# Altium footprint library PcbLib.PcbLib: 428 footprints (part 13 of 27)
Each footprint in its own frame and in the unit in brackets; x right, y up, seen from the top. Pads: shape width x height; smd on the part's side, far side on the other; paste and mask are expansions set on the pad; w line width, h text height; cw(c..) or ccw(c..) is an arc to the next point about the centre after c.
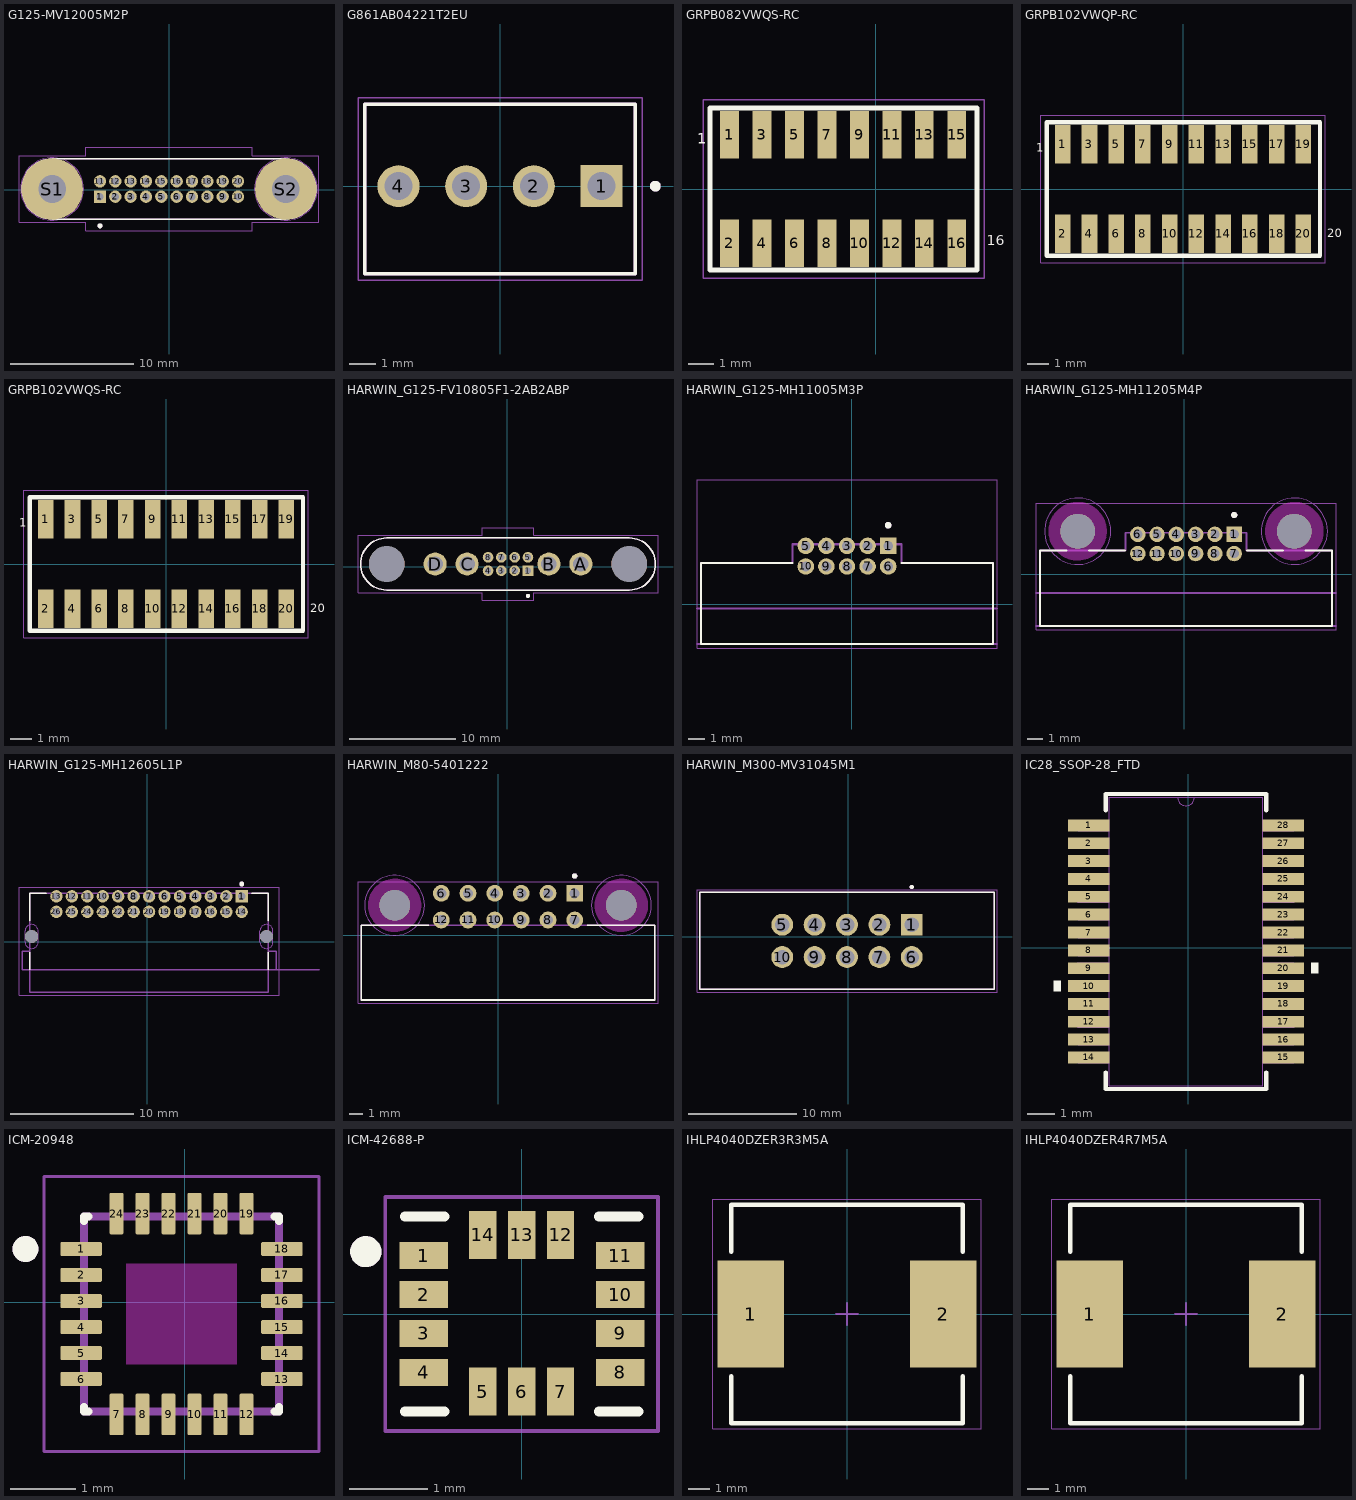
[diagram p12: the footprints below, top view; thin cyan lines are the x and y axes]

## G125-MV12005M2P [mm] "HARWIN Male Vertical Connector, 1.25mm Pitch, 10+10 contacts"
pads (22):
  rect 1x1 / inner round 1 / far side rect 1x1 hole 0.6: 1(-5.665,-0.581)
  round 1 hole 0.6: 2(-4.415,-0.581) 3(-3.165,-0.581) 4(-1.915,-0.581) 5(-0.665,-0.581) 6(0.585,-0.581) 7(1.835,-0.581) 8(3.085,-0.581) 9(4.335,-0.581) 10(5.585,-0.581) 11(-5.665,0.669) 12(-4.415,0.669) 13(-3.165,0.669) 14(-1.915,0.669) 15(-0.665,0.669) 16(0.585,0.669) 17(1.835,0.669) 18(3.085,0.669) 19(4.335,0.669) 20(5.585,0.669)
  round 5 hole 2.25 unplated: S1(-9.565,0.044) S2(9.485,0.044)
Top Overlay:
  circle w0.2: c-5.665,-2.956 r0.1
  lines w0.127: -12.015,0.044 ccw(c-9.565,0.044) -9.565,-2.406 9.485,-2.406 ccw(c9.485,0.044) 11.935,0.044 ccw(c9.485,0.044) 9.485,2.494 -9.565,2.494 ccw(c-9.565,0.044) -12.015,0.044
Mechanical 13:
  circle w0.2: c-5.665,-2.956 r0.1
  lines w0.127: -12.015,0.044 ccw(c-9.565,0.044) -9.565,-2.406 9.485,-2.406 ccw(c9.485,0.044) 11.935,0.044 ccw(c9.485,0.044) 9.485,2.494 -9.565,2.494 ccw(c-9.565,0.044) -12.015,0.044
Mechanical 15:
  lines w0.05: -12.265,-2.656 -12.265,2.744 -6.815,2.744 -6.815,3.444 6.735,3.444 6.735,2.744 12.185,2.744 12.185,-2.656 6.735,-2.656 6.735,-3.356 -6.815,-3.356 -6.815,-2.656 -12.265,-2.656
Mechanical 16:
  circle w0.05: c-9.565,0.044 r2.56
  circle w0.05: c9.485,0.044 r2.56
3D body "g125-mv12005m2p.stp": height 5, standoff -4.9, extent -11.996,-2.386 11.954,2.514

## G861AB04221T2EU [mm]
pads (4):
  rect 1.575x1.575 / inner round 1.575 / far side rect 1.575x1.575 hole 1.05: 1(3.81,0)
  round 1.575 hole 1.05: 2(1.27,0) 3(-1.27,0) 4(-3.81,0)
Top Overlay:
  circle w0.2: c5.83,0 r0.1
  lines w0.127: -5.08,-3.28 -5.08,3.07 5.08,3.07 5.08,-3.28 -5.08,-3.28
Mechanical 13:
  circle w0.2: c5.83,0 r0.1
  lines w0.127: -5.08,-3.28 -5.08,3.07 5.08,3.07 5.08,-3.28 -5.08,-3.28
Mechanical 15:
  lines w0.05: -5.33,-3.53 -5.33,3.32 5.33,3.32 5.33,-3.53 -5.33,-3.53
3D body "step_temp.STEP": height 10.8, standoff -3.4, extent -5.08,-3.28 5.08,3.07

## GRPB082VWQS-RC [mm]
pads (16):
  rect 0.74x1.85 smd: 1(-5.715,2.125) 2(-5.715,-2.125) 3(-4.445,2.125) 4(-4.445,-2.125) 5(-3.175,2.125) 6(-3.175,-2.125) 7(-1.905,2.125) 8(-1.905,-2.125) 9(-0.635,2.125) 10(-0.635,-2.125) 11(0.635,2.125) 12(0.635,-2.125) 13(1.905,2.125) 14(1.905,-2.125) 15(3.175,2.125) 16(3.175,-2.125)
Top Overlay:
  lines w0.2: -6.477,-3.175 3.961,-3.175 3.961,3.175 -6.477,3.175 -6.477,-3.175
  text "1" at -6.985,1.778 h0.41
  text "16" at 4.343,-2.192 h0.41
Mechanical 15:
  lines w0.05: -6.75,-3.5 4.252,-3.5 4.252,3.5 -6.75,3.5 -6.75,-3.5
3D body "GRPB082VWQS-RC.STEP": height 5, standoff 0, extent -6.343,-2.695 3.817,2.411

## GRPB102VWQP-RC [mm]
pads (20):
  rect 0.74x1.85 smd: 1(-5.715,2.125) 2(-5.715,-2.125) 3(-4.445,2.125) 4(-4.445,-2.125) 5(-3.175,2.125) 6(-3.175,-2.125) 7(-1.905,2.125) 8(-1.905,-2.125) 9(-0.635,2.125) 10(-0.635,-2.125) 11(0.635,2.125) 12(0.635,-2.125) 13(1.905,2.125) 14(1.905,-2.125) 15(3.175,2.125) 16(3.175,-2.125) 17(4.445,2.125) 18(4.445,-2.125) 19(5.715,2.125) 20(5.715,-2.125)
Top Overlay:
  lines w0.2: -6.477,-3.175 -6.477,3.175 6.502,3.175 6.502,-3.175 -6.477,-3.175
  text "20" at 6.858,-2.286 h0.41
  text "1" at -6.985,1.778 h0.41
Mechanical 15:
  lines w0.05: -6.75,-3.5 -6.75,3.5 6.75,3.5 6.75,-3.5 -6.75,-3.5
3D body "_ _ _B102VWQP-RC.STEP": height 5, standoff -0.5, extent -6.35,-2.54 6.35,2.56

## GRPB102VWQS-RC [mm]
pads (20):
  rect 0.74x1.85 smd: 1(-5.715,2.125) 2(-5.715,-2.125) 3(-4.445,2.125) 4(-4.445,-2.125) 5(-3.175,2.125) 6(-3.175,-2.125) 7(-1.905,2.125) 8(-1.905,-2.125) 9(-0.635,2.125) 10(-0.635,-2.125) 11(0.635,2.125) 12(0.635,-2.125) 13(1.905,2.125) 14(1.905,-2.125) 15(3.175,2.125) 16(3.175,-2.125) 17(4.445,2.125) 18(4.445,-2.125) 19(5.715,2.125) 20(5.715,-2.125)
Top Overlay:
  lines w0.2: -6.477,-3.175 6.502,-3.175 6.502,3.175 -6.477,3.175 -6.477,-3.175
  text "1" at -6.985,1.778 h0.41
  text "20" at 6.858,-2.286 h0.41
Mechanical 15:
  lines w0.05: -6.75,-3.5 6.75,-3.5 6.75,3.5 -6.75,3.5 -6.75,-3.5
3D body "_ _ _B102VWQP-RC.STEP": height 5, standoff -0.5, extent -6.35,-2.54 6.35,2.56

## HARWIN_G125-FV10805F1-2AB2ABP [mm] "HARWIN Power to the Board FML VRTCL 4PW 8 SIG Connector"
pads (14):
  rect 1x1 / inner round 1 / far side rect 1x1 hole 0.6: 1(1.952,-0.373)
  round 1 hole 0.6: 2(0.702,-0.373) 3(-0.548,-0.373) 4(-1.798,-0.373) 5(1.952,0.877) 6(0.702,0.877) 7(-0.548,0.877) 8(-1.798,0.877)
  round 2.175 hole 1.45: A(6.927,0.252) B(3.927,0.252) C(-3.773,0.252) D(-6.773,0.252)
  round 3.35 hole 3.35 unplated: ""(-11.323,0.252) ""(11.477,0.252)
Top Overlay:
  circle w0.2: c1.952,-2.748 r0.1
  lines w0.127: -13.773,0.252 cw(c-11.323,0.252) -11.323,2.702 11.477,2.702 cw(c11.477,0.252) 13.927,0.252 cw(c11.477,0.252) 11.477,-2.198 -11.323,-2.198 cw(c-11.323,0.252) -13.773,0.252
Mechanical 13:
  circle w0.2: c1.952,-2.748 r0.1
  lines w0.127: -13.773,0.252 cw(c-11.323,0.252) -11.323,2.702 11.477,2.702 cw(c11.477,0.252) 13.927,0.252 cw(c11.477,0.252) 11.477,-2.198 -11.323,-2.198 cw(c-11.323,0.252) -13.773,0.252
Mechanical 15:
  lines w0.05: -14.023,-2.448 -2.323,-2.448 -2.323,-3.148 2.477,-3.148 2.477,-2.448 14.177,-2.448 14.177,2.952 2.477,2.952 2.477,3.652 -2.323,3.652 -2.323,2.952 -14.023,2.952 -14.023,-2.448
3D body "G125-FV10805F1-2AB2AB_asm.stp": height 5, standoff -5.15, extent -13.771,-2.207 13.929,2.693

## HARWIN_G125-MH11005M3P [mm] "HARWIN 5+5 MALE Conn. Screw Lock Mount"
pads (10):
  rect 1x1 / inner round 1 / far side rect 1x1 hole 0.6: 1(2.224,3.542)
  round 1 hole 0.6: 2(0.974,3.542) 3(-0.276,3.542) 4(-1.526,3.542) 5(-2.776,3.542) 6(2.224,2.292) 7(0.974,2.292) 8(-0.276,2.292) 9(-1.526,2.292) 10(-2.776,2.292)
Top Overlay:
  circle w0.2: c2.224,4.792 r0.1
  lines w0.127: -3.596,2.492 -9.126,2.492 -9.126,-2.408 8.574,-2.408 8.574,2.492 3.044,2.492
Mechanical 13:
  circle w0.2: c2.224,4.792 r0.1
  lines w0.127: -9.376,-2.408 8.824,-2.408 ; -9.376,-0.258 8.824,-0.258 ; -9.126,-2.408 8.574,-2.408 8.574,2.492 3.024,2.492 3.024,3.642 -3.576,3.642 -3.576,2.492 -9.126,2.492 -9.126,-2.408
  text "PCB edge for Shielded Cable" at -7.276,-1.208 h0.81
  text "PCB edge for Unshielded Cable" at -7.276,-3.708 h0.81
Mechanical 15:
  lines w0.05: -9.376,-2.658 -9.376,7.542 8.824,7.542 8.824,-2.658 -9.376,-2.658
3D body "G125-MH11005M4P--3DModel-STEP-56544.STEP": height 5.25, standoff -3.3, extent -9.154,-2.415 8.546,5.285

## HARWIN_G125-MH11205M4P [mm] "HARWIN 6+6 Pos Male Connector Screw-Lock Board Mount"
pads (14):
  rect 1x1 / inner round 1 / far side rect 1x1 hole 0.6: 1(3.253,2.602)
  round 1 hole 0.6: 2(2.003,2.602) 3(0.753,2.602) 4(-0.497,2.602) 5(-1.747,2.602) 6(-2.997,2.602) 7(3.253,1.352) 8(2.003,1.352) 9(0.753,1.352) 10(-0.497,1.352) 11(-1.747,1.352) 12(-2.997,1.352)
  round 2.25 hole 2.25 unplated: ""(-6.897,2.802) ""(7.153,2.802)
Top Overlay:
  circle w0.2: c3.253,3.852 r0.1
  lines w0.127: -7.627,1.552 -9.347,1.552 -9.347,-3.348 9.603,-3.348 9.603,1.552 7.883,1.552 ; -6.167,1.552 -3.817,1.552 ; 4.073,1.552 6.423,1.552
Keep-Out Layer:
  circle w1.9: c7.153,2.802 r0.95
  circle w1.9: c7.153,2.802 r0.95
  circle w1.9: c-6.897,2.802 r0.95
  circle w1.9: c-6.897,2.802 r0.95
Mechanical 13:
  circle w0.2: c3.253,3.852 r0.1
  lines w0.127: -9.597,-3.348 9.853,-3.348 ; -9.597,-1.198 9.853,-1.198 ; -9.347,-3.348 9.603,-3.348 9.603,1.552 4.053,1.552 4.053,2.702 -3.797,2.702 -3.797,1.552 -9.347,1.552 -9.347,-3.348
  text "PCB edge for Shielded Cable" at -6.872,-2.398 h0.81
  text "PCB edge for Unshielded Cable" at -6.872,-4.648 h0.81
Mechanical 15:
  lines w0.05: -9.597,-3.598 -9.597,4.602 9.853,4.602 9.853,-3.598 -9.597,-3.598
Mechanical 16:
  circle w0.05: c7.153,2.802 r2.15
  circle w0.05: c-6.897,2.802 r2.15
3D body "step_temp.STEP": height 5.25, standoff -3.3, extent -9.347,-3.348 9.603,4.352

## HARWIN_G125-MH12605L1P [mm] "Gecko DIL Male Horizontal 3.3mm Throughboard Connector, Latches for 1.6mm thick PCB, gold, pick & place (cut tape packing), 13+13 contacts"
pads (28):
  rect 1x1 / inner round 1 / far side rect 1x1 hole 0.6: 1(7.664,3.683)
  round 1 hole 0.6: 2(6.414,3.683) 3(5.164,3.683) 4(3.914,3.683) 5(2.664,3.683) 6(1.414,3.683) 7(0.164,3.683) 8(-1.086,3.683) 9(-2.336,3.683) 10(-3.586,3.683) 11(-4.836,3.683) 12(-6.086,3.683) 13(-7.336,3.683) 14(7.664,2.433) 15(6.414,2.433) 16(5.164,2.433) 17(3.914,2.433) 18(2.664,2.433) 19(1.414,2.433) 20(0.164,2.433) 21(-1.086,2.433) 22(-2.336,2.433) 23(-3.586,2.433) 24(-4.836,2.433) 25(-6.086,2.433) 26(-7.336,2.433)
  round 1.05 hole 1.05 unplated: ""(-9.336,0.433) ""(9.664,0.433)
Top Overlay:
  circle w0.2: c7.664,4.683 r0.1
  lines w0.127: -9.486,-2.267 -9.486,-0.862 ; -9.486,1.728 -9.486,3.933 -8.156,3.933 ; 8.484,3.933 9.814,3.933 9.814,1.728 ; 9.814,-2.267 9.814,-0.862
Top Solder:
  drawing of 2 lines, arcs and shapes, not listed
Bottom Solder:
  drawing of 2 lines, arcs and shapes, not listed
Mechanical 1:
  lines w0: -9.861,-0.017 ccw(c-9.336,-0.017) -9.336,-0.542 ccw(c-9.336,-0.017) -8.811,-0.017 -8.811,0.883 ccw(c-9.336,0.883) -9.336,1.408 ccw(c-9.336,0.883) -9.861,0.883 -9.861,-0.017 ; 9.139,-0.017 ccw(c9.664,-0.017) 9.664,-0.542 ccw(c9.664,-0.017) 10.189,-0.017 10.189,0.883 ccw(c9.664,0.883) 9.664,1.408 ccw(c9.664,0.883) 9.139,0.883 9.139,-0.017
Mechanical 13:
  circle w0.2: c7.664,4.683 r0.1
  lines w0.127: 13.914,-2.267 10.439,-2.267 ; -9.486,-2.267 -9.486,-0.747 ; -9.486,-2.267 9.814,-2.267 ; -9.486,-2.267 -9.486,-4.067 9.814,-4.067 9.814,-2.267 ; -9.486,-2.267 -10.111,-2.267 -10.111,-0.747 -9.486,-0.747 ; -9.486,-0.747 -9.486,3.933 9.814,3.933 9.814,-0.747 ; 9.814,-2.267 9.814,-0.747 ; 9.814,-2.267 10.439,-2.267 ; 9.814,-0.747 10.439,-0.747 10.439,-2.267
  text "PCB EDGE" at 10.914,-2.067 h1.02
Mechanical 15:
  lines w0.05: -10.361,-4.317 -10.361,4.433 10.689,4.433 10.689,-4.317 -10.361,-4.317
3D body "step_temp.STEP": height 5.5, standoff -3.24, extent -10.026,-4.067 10.354,4.133

## HARWIN_M80-5401222 [mm] "HARWIN 6+6 Datamate J-Tek MALE 3mm connector"
pads (14):
  rect 1.258x1.258 / inner round 1.258 / far side rect 1.258x1.258 hole 0.75: 1(5.723,3.16)
  round 1.258 hole 0.75: 2(3.723,3.16) 3(1.723,3.16) 4(-0.277,3.16) 5(-2.277,3.16) 6(-4.277,3.16) 7(5.723,1.16) 8(3.723,1.16) 9(1.723,1.16) 10(-0.277,1.16) 11(-2.277,1.16) 12(-4.277,1.16)
  round 2.3 hole 2.3 unplated: ""(-7.777,2.26) ""(9.223,2.26)
Top Overlay:
  circle w0.2: c5.723,4.46 r0.1
  lines w0.127: -5.226,0.76 -10.277,0.76 -10.277,-4.84 11.723,-4.84 11.723,0.76 6.672,0.76
Keep-Out Layer:
  circle w2: c9.223,2.26 r1
  circle w2: c-7.777,2.26 r1
  circle w2: c9.223,2.26 r1
  circle w2: c-7.777,2.26 r1
Mechanical 13:
  circle w0.2: c5.723,4.46 r0.1
  lines w0.127: -10.277,-4.84 11.723,-4.84 11.723,0.76 -10.277,0.76 -10.277,-4.84
Mechanical 15:
  lines w0.05: -10.527,-5.09 11.973,-5.09 11.973,4.039 -10.527,4.039 -10.527,-5.09
Mechanical 16:
  circle w0.05: c9.223,2.26 r2.25
  circle w0.05: c-7.777,2.26 r2.25

## HARWIN_M300-MV31045M1 [mm] "HARWIN 10 Pin MALE VRTCL Connector"
pads (10):
  rect 2.025x2.025 / inner round 2.025 / far side rect 2.025x2.025 hole 1.35: 1(5.89,1.102)
  round 2.025 hole 1.35: 2(2.89,1.102) 3(-0.11,1.102) 4(-3.11,1.102) 5(-6.11,1.102) 6(5.89,-1.898) 7(2.89,-1.898) 8(-0.11,-1.898) 9(-3.11,-1.898) 10(-6.11,-1.898)
Top Overlay:
  circle w0.2: c5.89,4.602 r0.1
  lines w0.127: -13.76,-4.898 13.54,-4.898 13.54,4.102 -13.76,4.102 -13.76,-4.898
Mechanical 13:
  circle w0.2: c5.89,4.602 r0.1
  lines w0.127: -13.76,-4.898 13.54,-4.898 13.54,4.102 -13.76,4.102 -13.76,-4.898
Mechanical 15:
  lines w0.05: -14.01,-5.148 -14.01,4.352 13.79,4.352 13.79,-5.148 -14.01,-5.148
3D body "m300-mv31045m1.stp": height 6.9, standoff -3.2, extent -13.76,-4.898 13.54,4.102

## IC28_SSOP-28_FTD [mm]
pads (28):
  rect 1.506x0.431 smd paste+0 mask+0: 1(-3.623,4.454) 2(-3.623,3.804) 3(-3.623,3.154) 4(-3.623,2.504) 5(-3.623,1.854) 6(-3.623,1.204) 7(-3.623,0.554) 8(-3.623,-0.096) 9(-3.623,-0.746) 10(-3.623,-1.396) 11(-3.623,-2.046) 12(-3.623,-2.696) 13(-3.623,-3.346) 14(-3.623,-3.996) 15(3.471,-3.996) 16(3.471,-3.346) 17(3.471,-2.696) 18(3.471,-2.046) 19(3.471,-1.396) 20(3.471,-0.746) 21(3.471,-0.096) 22(3.471,0.554) 23(3.471,1.204) 24(3.471,1.854) 25(3.471,2.504) 26(3.471,3.154) 27(3.471,3.804) 28(3.471,4.454)
Top Overlay:
  region: -4.63,-1.206 -4.884,-1.206 -4.884,-1.587 -4.63,-1.587
  region: 4.477,-0.556 4.731,-0.556 4.731,-0.937 4.477,-0.937
  lines w0.152: -2.997,-4.545 -2.997,-5.143 2.845,-5.143 2.845,-4.545 ; -2.997,5.002 -2.997,5.601 2.845,5.601 2.845,5.002
Mechanical 13:
  lines w0.025: -0.381,5.474 ccw(c-0.076,5.474) 0.229,5.474 ; -4.026,-4.187 -4.026,-3.806 -2.87,-3.806 -2.87,-4.187 -4.026,-4.187 ; -4.026,-3.537 -4.026,-3.156 -2.87,-3.156 -2.87,-3.537 -4.026,-3.537 ; -4.026,-2.887 -4.026,-2.506 -2.87,-2.506 -2.87,-2.887 -4.026,-2.887 ; -4.026,-2.237 -4.026,-1.856 -2.87,-1.856 -2.87,-2.237 -4.026,-2.237 ; -4.026,-1.587 -4.026,-1.206 -2.87,-1.206 -2.87,-1.587 -4.026,-1.587 ; -4.026,-0.937 -4.026,-0.556 -2.87,-0.556 -2.87,-0.937 -4.026,-0.937 ; -4.026,-0.287 -4.026,0.094 -2.87,0.094 -2.87,-0.287 -4.026,-0.287 ; -4.026,0.363 -4.026,0.744 -2.87,0.744 -2.87,0.363 -4.026,0.363 ; -4.026,1.013 -4.026,1.394 -2.87,1.394 -2.87,1.013 -4.026,1.013 ; -4.026,1.663 -4.026,2.044 -2.87,2.044 -2.87,1.663 -4.026,1.663 ; -4.026,2.313 -4.026,2.694 -2.87,2.694 -2.87,2.313 -4.026,2.313 ; -4.026,2.963 -4.026,3.344 -2.87,3.344 -2.87,2.963 -4.026,2.963 ; -4.026,3.613 -4.026,3.994 -2.87,3.994 -2.87,3.613 -4.026,3.613 ; -4.026,4.263 -4.026,4.644 -2.87,4.644 -2.87,4.263 -4.026,4.263 ; -2.87,-5.016 2.718,-5.016 2.718,5.474 -2.87,5.474 -2.87,-5.016 ; 2.718,-4.187 2.718,-3.806 3.873,-3.806 3.873,-4.187 2.718,-4.187 ; 2.718,-3.537 2.718,-3.156 3.873,-3.156 3.873,-3.537 2.718,-3.537 ; 2.718,-2.887 2.718,-2.506 3.873,-2.506 3.873,-2.887 2.718,-2.887 ; 2.718,-2.237 2.718,-1.856 3.873,-1.856 3.873,-2.237 2.718,-2.237 ; 2.718,-1.587 2.718,-1.206 3.873,-1.206 3.873,-1.587 2.718,-1.587 ; 2.718,-0.937 2.718,-0.556 3.873,-0.556 3.873,-0.937 2.718,-0.937 ; 2.718,-0.287 2.718,0.094 3.873,0.094 3.873,-0.287 2.718,-0.287 ; 2.718,0.363 2.718,0.744 3.873,0.744 3.873,0.363 2.718,0.363 ; 2.718,1.013 2.718,1.394 3.873,1.394 3.873,1.013 2.718,1.013 ; 2.718,1.663 2.718,2.044 3.873,2.044 3.873,1.663 2.718,1.663 ; 2.718,2.313 2.718,2.694 3.873,2.694 3.873,2.313 2.718,2.313 ; 2.718,2.963 2.718,3.344 3.873,3.344 3.873,2.963 2.718,2.963 ; 2.718,3.613 2.718,3.994 3.873,3.994 3.873,3.613 2.718,3.613 ; 2.718,4.263 2.718,4.644 3.873,4.644 3.873,4.263 2.718,4.263
3D body "IC28_SSOP-28_FTD.step": height 2.01, standoff 0, extent -4.026,-5.016 3.874,5.474

## ICM-20948 [mm] "gyroscope"
pads (24):
  rrect25% 0.64x0.22 smd: 1(-1.596,0.822) 2(-1.596,0.422) 3(-1.596,0.022) 4(-1.596,-0.378) 5(-1.596,-0.778) 6(-1.596,-1.178) 13(1.494,-1.178) 14(1.494,-0.778) 15(1.494,-0.378) 16(1.494,0.022) 17(1.494,0.422) 18(1.494,0.822)
  rrect25% 0.22x0.64 smd: 7(-1.051,-1.723) 8(-0.651,-1.723) 9(-0.251,-1.723) 10(0.149,-1.723) 11(0.549,-1.723) 12(0.949,-1.723) 19(0.949,1.367) 20(0.549,1.367) 21(0.149,1.367) 22(-0.251,1.367) 23(-0.651,1.367) 24(-1.051,1.367)
Top Overlay:
  circle w0.2: c-2.451,0.822 r0.1
  lines w0.127: -1.551,-1.608 -1.551,-1.678 -1.481,-1.678 ; -1.551,1.252 -1.551,1.322 -1.481,1.322 ; 1.379,-1.678 1.449,-1.678 1.449,-1.608 ; 1.379,1.322 1.449,1.322 1.449,1.252
Keep-Out Layer:
  region: 0.799,-0.948 -0.901,-0.948 -0.901,0.592 0.799,0.592
Mechanical 13:
  circle w0.2: c-2.451,0.822 r0.1
  lines w0.127: -1.551,-1.678 -1.551,1.322 1.449,1.322 1.449,-1.678 -1.551,-1.678
Mechanical 15:
  lines w0.05: -2.166,-2.293 -2.166,1.937 2.064,1.937 2.064,-2.293 -2.166,-2.293
3D body "step_temp.STEP": height 1, standoff -0.05, extent -1.551,-1.678 1.449,1.322

## ICM-42688-P [mm]
pads (14):
  rect 0.62x0.35 smd: 1(-1.255,0.75) 2(-1.255,0.25) 3(-1.255,-0.25) 4(-1.255,-0.75) 8(1.265,-0.75) 9(1.265,-0.25) 10(1.265,0.25) 11(1.265,0.75)
  rect 0.35x0.62 smd: 5(-0.5,-0.995) 6(0,-0.995) 7(0.5,-0.995) 12(0.5,1.015) 13(0,1.015) 14(-0.5,1.015)
Top Overlay:
  circle w0.2: c-2,0.8 r0.1
  lines w0.127: -1.5,-1.25 -0.99,-1.25 ; -1.5,1.25 -0.99,1.25 ; 0.99,-1.25 1.5,-1.25 ; 0.99,1.25 1.5,1.25
Mechanical 13:
  circle w0.2: c-2,0.8 r0.1
Mechanical 15:
  lines w0.05: -1.75,-1.5 1.75,-1.5 1.75,1.5 -1.75,1.5 -1.75,-1.5
3D body "ICM-42688-P.step": height 0.97, standoff 0, extent -1.49,-1.24 1.51,1.26

## IHLP4040DZER3R3M5A [mm] "Precision Wire Wound Inductor, 2-Leads, Body 10.80x10.16mm, IPC Medium Density"
height 4
pads (2):
  rect 3.1x5 smd: 1(-4.5,0) 2(4.5,0)
Top Overlay:
  lines w0.2: -5.4,-2.9 -5.4,-5.1 5.4,-5.1 5.4,-2.9 ; -5.4,2.9 -5.4,5.1 5.4,5.1 5.4,2.9
Mechanical 15:
  lines w0.05: -6.275,-5.35 6.275,-5.35 6.275,5.35 -6.275,5.35 -6.275,-5.35
  lines w0.1: -0.5,0 0.5,0 ; 0,-0.5 0,0.5
3D body "IHLP4040DZ (2.2-100uH).STEP": height 4.08, standoff 0.2, extent -5.303,-5.13 5.319,5.086

## IHLP4040DZER4R7M5A [mm] "Precision Wire Wound Inductor, 2-Leads, Body 10.80x10.16mm, IPC Medium Density"
height 4
pads (2):
  rect 3.1x5 smd: 1(-4.5,0) 2(4.5,0)
Top Overlay:
  lines w0.2: -5.4,-2.9 -5.4,-5.1 5.4,-5.1 5.4,-2.9 ; -5.4,2.9 -5.4,5.1 5.4,5.1 5.4,2.9
Mechanical 15:
  lines w0.05: -6.275,-5.35 6.275,-5.35 6.275,5.35 -6.275,5.35 -6.275,-5.35
  lines w0.1: -0.5,0 0.5,0 ; 0,-0.5 0,0.5
3D body "IHLP4040DZ (2.2-100uH).STEP": height 4.08, standoff 0.2, extent -5.303,-5.13 5.319,5.086